# Altium footprint library XU-GENARAL PCB .PcbLib: 1176 footprints (part 20 of 75)
Each footprint in its own frame and in the unit in brackets; x right, y up, seen from the top. Pads: shape width x height; smd on the part's side, far side on the other; paste and mask are expansions set on the pad; w line width, h text height; cw(c..) or ccw(c..) is an arc to the next point about the centre after c.
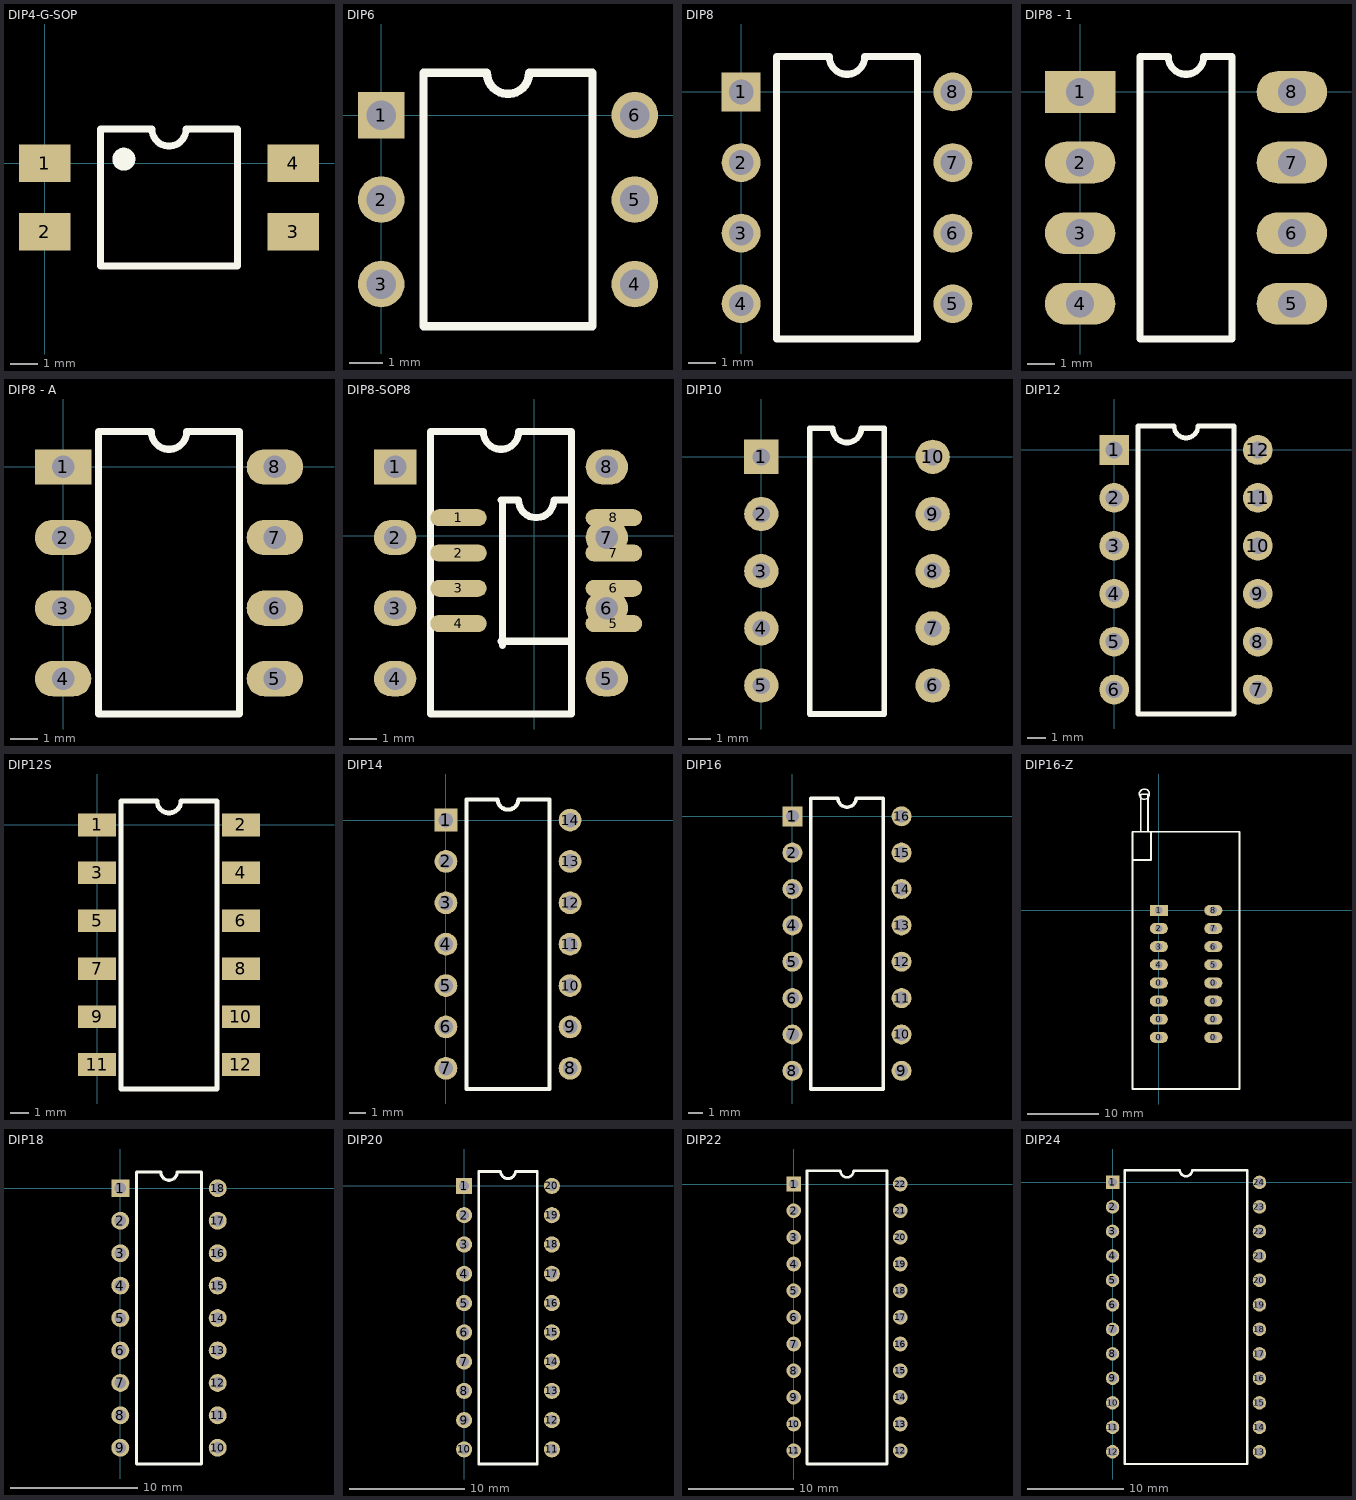
[diagram p19: the footprints below, top view; thin cyan lines are the x and y axes]

## DIP4-G-SOP [mm]
pads (4):
  rect 1.905x1.4 smd: 1(0,0) 2(0,-2.54) 3(9.22,-2.54) 4(9.22,0)
Top Overlay:
  rectangle: 2.756,-0.051 3.137,0.33
  lines w0.254: 3.235,0.19 ccw(c2.937,0.153) 3.236,0.183 ; 2.07,-3.81 2.07,1.27 3.975,1.27 ccw(c4.61,1.27) 5.245,1.27 7.15,1.27 7.15,-3.81 2.07,-3.81

## DIP6 [mil]
pads (6):
  rect 55x55 hole 35: 1(0,0)
  round 55 hole 35: 2(0,-100) 3(0,-200) 4(300,-200) 5(300,-100) 6(300,0)
Top Overlay:
  lines w10: 50,-250 250,-250 250,50 175,50 cw(c150,50) 125,50 50,50 50,-250

## DIP8 [mil]
pads (8):
  rect 55x55 hole 35: 1(0,0)
  round 55 hole 35: 2(0,-100) 3(0,-200) 4(0,-300) 5(300,-300) 6(300,-200) 7(300,-100) 8(300,0)
Top Overlay:
  lines w10: 50,-350 250,-350 250,50 175,50 cw(c150,50) 125,50 50,50 50,-350

## DIP8 - 1 [mm]
pads (8):
  rect 2.54x1.5 hole 1: 1(0,0)
  oval 2.54x1.5 hole 1: 2(0,-2.54) 3(0,-5.08) 4(0,-7.62) 5(7.62,-7.62) 6(7.62,-5.08) 7(7.62,-2.54) 8(7.62,0)
Top Overlay:
  lines w0.254: 2.159,-8.89 5.461,-8.89 5.461,1.27 4.445,1.27 cw(c3.81,1.27) 3.175,1.27 2.159,1.27 2.159,-8.89

## DIP8 - A [mil]
pads (8):
  rect 80x50 hole 32: 1(-0.14,-0.34)
  oval 80x50 hole 32: 2(-0.14,-100.33) 3(-0.14,-200.34) 4(-0.14,-300.33) 5(299.86,-300.33) 6(299.86,-200.34) 7(299.86,-100.33) 8(299.86,-0.34)
Top Overlay:
  lines w10: 49.86,-350.33 249.86,-350.33 249.86,49.66 174.86,49.66 cw(c149.86,49.66) 124.86,49.66 49.86,49.66 49.86,-350.33

## DIP8-SOP8 [mil]
pads (16):
  rect 60x50 hole 32: 1(-197.14,97.67)
  oval 80x24 smd: 1(-107.26,25.74) 2(-107.26,-24.26) 3(-107.26,-74.26) 4(-107.26,-124.26) 5(112.74,-124.26) 6(112.74,-74.26) 7(112.74,-24.26) 8(112.74,25.74)
  oval 60x50 hole 32: 2(-197.14,-2.33) 3(-197.14,-102.33) 4(-197.14,-202.34) 5(102.86,-202.34) 6(102.86,-102.33) 7(102.86,-2.33) 8(102.86,97.67)
Top Overlay:
  lines w10: -47.26,-149.26 52.74,-149.26 52.74,50.74 27.74,50.74 cw(c2.74,50.74) -22.26,50.74 -47.26,50.74 ; -45,-155 -45,45 ; -147.14,-252.34 52.86,-252.34 52.86,147.66 -22.14,147.66 cw(c-47.14,147.66) -72.14,147.66 -147.14,147.66 -147.14,-252.34

## DIP10 [mil]
height 43.31
pads (10):
  rect 60x60 hole 30: 1(0,0)
  round 60 hole 30: 2(0,-100) 3(0,-200) 4(0,-300) 5(0,-400) 6(300,-400) 7(300,-300) 8(300,-200) 9(300,-100) 10(300,0)
Top Overlay:
  lines w10: 85,-450 215,-450 215,50 175,50 cw(c150,50) 125,50 85,50 85,-450

## DIP12 [mil]
pads (12):
  rect 62x62 hole 35: 1(0,0)
  round 62 hole 35: 2(0,-100) 3(0,-200) 4(0,-300) 5(0,-400) 6(0,-500) 7(300,-500) 8(300,-400) 9(300,-300) 10(300,-200) 11(300,-100) 12(300,0)
Top Overlay:
  lines w10: 50,-551 250,-551 ; 50,-550 50,50 125,50 ccw(c150,50) 175,50 250,50 250,-550

## DIP12S [mm]
pads (12):
  rect 2x1.2 smd: 1(0,0) 2(7.62,0) 3(0,-2.54) 4(7.62,-2.54) 5(0,-5.08) 6(7.62,-5.08) 7(0,-7.62) 8(7.62,-7.62) 9(0,-10.16) 10(7.62,-10.16) 11(0,-12.7) 12(7.62,-12.7)
Top Overlay:
  lines w0.254: 1.27,-13.995 6.35,-13.995 ; 1.27,-13.97 1.27,1.27 3.175,1.27 ccw(c3.81,1.27) 4.445,1.27 6.35,1.27 6.35,-13.97

## DIP14 [mil]
pads (14):
  rect 55x55 hole 35: 1(0,0)
  round 55 hole 35: 2(0,-100) 3(0,-200) 4(0,-300) 5(0,-400) 6(0,-500) 7(0,-600) 8(300,-600) 9(300,-500) 10(300,-400) 11(300,-300) 12(300,-200) 13(300,-100) 14(300,0)
Top Overlay:
  lines w10: 50,-650 250,-650 250,50 175,50 cw(c150,50) 125,50 50,50 50,-650

## DIP16 [mil]
pads (16):
  rect 55x55 hole 35: 1(0,0)
  round 55 hole 35: 2(0,-100) 3(0,-200) 4(0,-300) 5(0,-400) 6(0,-500) 7(0,-600) 8(0,-700) 9(300,-700) 10(300,-600) 11(300,-500) 12(300,-400) 13(300,-300) 14(300,-200) 15(300,-100) 16(300,0)
Top Overlay:
  lines w10: 50,-750 50,50 125,50 ccw(c150,50) 175,50 250,50 250,-750 50,-750

## DIP16-Z [mil]
pads (16):
  oval 100x60 hole 40: 0(0,-700) 0(0,-600) 0(0,-500) 0(0,-400) 0(300,-700) 0(300,-600) 0(300,-500) 0(300,-400) 2(0,-100) 3(0,-200) 4(0,-300) 5(300,-300) 6(300,-200) 7(300,-100) 8(300,0)
  rect 100x60 hole 40: 1(0,0)
Top Overlay:
  circle w8: c-80,640 r28.44
  lines w10: -145.67,278 -43,278 -43,433.07 ; -100,433.07 -100,640 -59,640 -59,433.07 ; -145.67,-984.25 -145.67,433.07 444.88,433.07 444.88,-984.25 -145.67,-984.25

## DIP18 [mil]
pads (18):
  rect 55x55 hole 35: 1(0,0)
  round 55 hole 35: 2(0,-100) 3(0,-200) 4(0,-300) 5(0,-400) 6(0,-500) 7(0,-600) 8(0,-700) 9(0,-800) 10(300,-800) 11(300,-700) 12(300,-600) 13(300,-500) 14(300,-400) 15(300,-300) 16(300,-200) 17(300,-100) 18(300,0)
Top Overlay:
  lines w10: 50,-850 50,50 125,50 ccw(c150,50) 175,50 250,50 250,-850 50,-850

## DIP20 [mil]
pads (20):
  rect 55x55 hole 35: 1(0,0)
  round 55 hole 35: 2(0,-100) 3(0,-200) 4(0,-300) 5(0,-400) 6(0,-500) 7(0,-600) 8(0,-700) 9(0,-800) 10(0,-900) 11(300,-900) 12(300,-800) 13(300,-700) 14(300,-600) 15(300,-500) 16(300,-400) 17(300,-300) 18(300,-200) 19(300,-100) 20(300,0)
Top Overlay:
  lines w10: 50,-950 50,50 125,50 ccw(c150,50) 175,50 250,50 250,-950 50,-950

## DIP22 [mil]
pads (22):
  rect 55x55 hole 35: 1(0,0)
  round 55 hole 35: 2(0,-100) 3(0,-200) 4(0,-300) 5(0,-400) 6(0,-500) 7(0,-600) 8(0,-700) 9(0,-800) 10(0,-900) 11(0,-1000) 12(400,-1000) 13(400,-900) 14(400,-800) 15(400,-700) 16(400,-600) 17(400,-500) 18(400,-400) 19(400,-300) 20(400,-200) 21(400,-100) 22(400,0)
Top Overlay:
  lines w10: 50,-1050 50,50 175,50 ccw(c200,50) 225,50 350,50 350,-1050 50,-1050

## DIP24 [mil]
pads (24):
  rect 55x55 hole 35: 1(0,0)
  round 55 hole 35: 2(0,-100) 3(0,-200) 4(0,-300) 5(0,-400) 6(0,-500) 7(0,-600) 8(0,-700) 9(0,-800) 10(0,-900) 11(0,-1000) 12(0,-1100) 13(600,-1100) 14(600,-1000) 15(600,-900) 16(600,-800) 17(600,-700) 18(600,-600) 19(600,-500) 20(600,-400) 21(600,-300) 22(600,-200) 23(600,-100) 24(600,0)
Top Overlay:
  lines w10: 50,-1150 50,50 275,50 ccw(c300,50) 325,50 550,50 550,-1150 50,-1150